# Altium footprint library MyPcbLib.PcbLib: 278 footprints (part 3 of 18)
Each footprint in its own frame and in the unit in brackets; x right, y up, seen from the top. Pads: shape width x height; smd on the part's side, far side on the other; paste and mask are expansions set on the pad; w line width, h text height; cw(c..) or ccw(c..) is an arc to the next point about the centre after c.
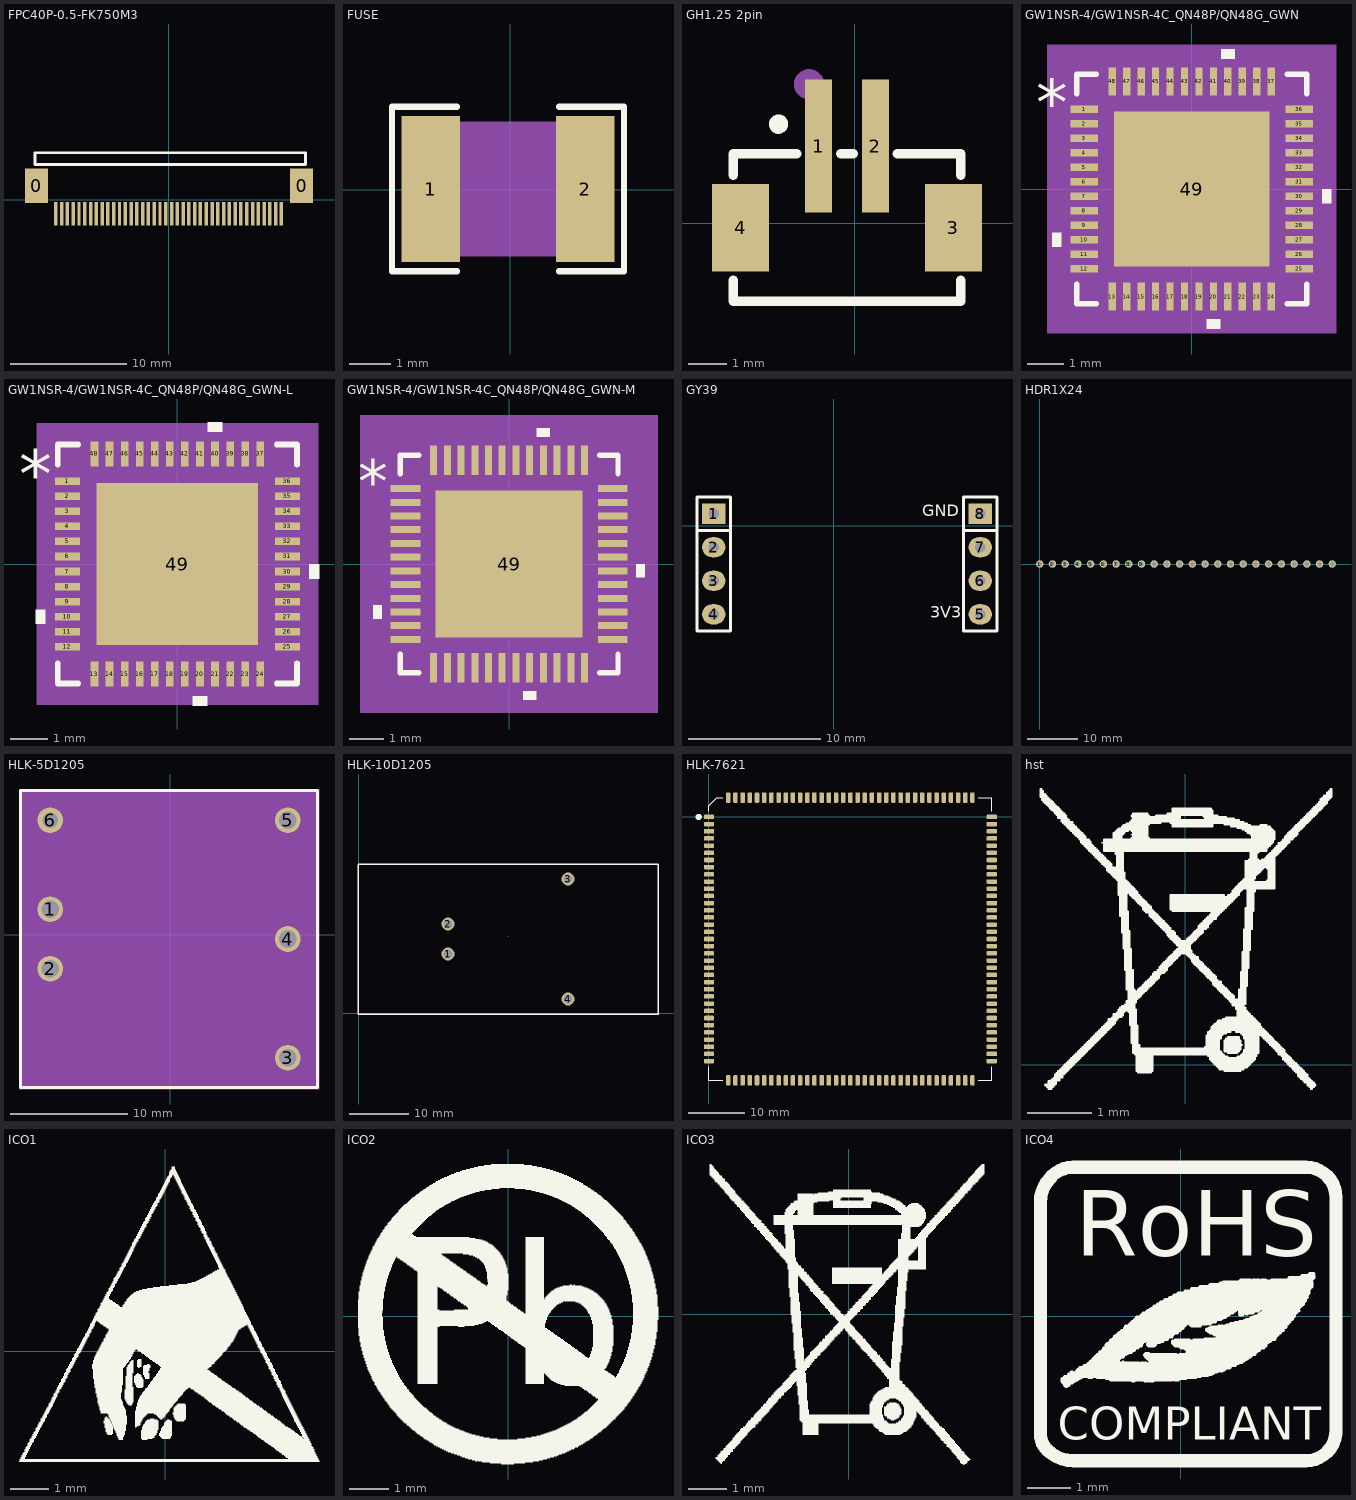
[diagram p2: the footprints below, top view; thin cyan lines are the x and y axes]

## FPC40P-0.5-FK750M3 [mm]
pads (42):
  rect 2x3 smd: 0(-11.465,1.202) 0(11.465,1.202)
  rect 0.3x2 smd: 1(9.721,-1.202) 2(9.221,-1.202) 3(8.721,-1.202) 4(8.221,-1.202) 5(7.721,-1.202) 6(7.221,-1.202) 7(6.721,-1.202) 8(6.221,-1.202) 9(5.721,-1.202) 10(5.221,-1.202) 11(4.721,-1.202) 12(4.221,-1.202) 13(3.721,-1.202) 14(3.221,-1.202) 15(2.721,-1.202) 16(2.221,-1.202) 17(1.721,-1.202) 18(1.221,-1.202) 19(0.721,-1.202) 20(0.221,-1.202) 21(-0.279,-1.202) 22(-0.779,-1.202) 23(-1.279,-1.202) 24(-1.779,-1.202) 25(-2.279,-1.202) 26(-2.779,-1.202) 27(-3.279,-1.202) 28(-3.779,-1.202) 29(-4.279,-1.202) 30(-4.779,-1.202) 31(-5.279,-1.202) 32(-5.779,-1.202) 33(-6.279,-1.202) 34(-6.779,-1.202) 35(-7.279,-1.202) 36(-7.779,-1.202) 37(-8.279,-1.202) 38(-8.779,-1.202) 39(-9.279,-1.202) 40(-9.779,-1.202)
Top Overlay:
  lines w0.254: -11.585,3.049 11.815,3.049 11.815,4.065 -11.585,4.065 -11.585,3.049
3D body "User Library-FPC-40-2.STEP": height 1.95, standoff 0, extent -12.23,-1.755 12.17,4.545

## FUSE [mm]
pads (2):
  rect 1.407x3.499 smd: 1(-1.913,0.022) 2(1.794,0.022)
Top Overlay:
  lines w0.152: -1.286,-1.956 -2.845,-1.956 -2.845,2.001 -1.286,2.001 ; 1.167,-1.956 2.726,-1.956 2.726,2.001 1.167,2.001
Top Paste:
  region: 1.09,-1.627 1.09,-0.672 1.19,-0.572 1.469,-0.572 1.569,-0.472 1.569,0.517 1.469,0.617 1.19,0.617 1.09,0.717 1.09,1.672 1.19,1.772 2.397,1.772 2.497,1.672 2.497,-1.627 2.397,-1.727 1.19,-1.727
  region: -1.21,-1.627 -1.21,-0.672 -1.31,-0.572 -1.588,-0.572 -1.688,-0.472 -1.688,0.517 -1.588,0.617 -1.31,0.617 -1.21,0.717 -1.21,1.672 -1.31,1.772 -2.516,1.772 -2.616,1.672 -2.616,-1.627 -2.516,-1.727 -1.31,-1.727
Mechanical 4:
  region: -2.335,-1.598 -2.335,1.642 2.215,1.642 2.215,-1.598
Mechanical 5:
  region: -2.335,-1.598 -2.335,1.642 -1.585,1.642 -1.585,-1.598
  region: 2.215,-1.598 2.215,1.642 1.465,1.642 1.465,-1.598
Mechanical 6:
  circle w0.06: c-2.335,-1.598 r0.03
Mechanical 15:
  lines w0.003: -0.085,0.399 -0.034,0.449

## GH1.25 2pin [mm]
pads (4):
  rect 0.7x3.5 smd: 1(-0.955,2.034) 2(0.545,2.034)
  rect 1.5x2.3 smd: 3(2.595,-0.116) 4(-3.005,-0.116)
Top Overlay:
  circle w0.254: c-2.007,2.61 r0.127
  lines w0.254: -3.205,-1.497 -3.205,-2.054 2.795,-2.054 2.795,-1.497 ; -3.205,1.265 -3.205,1.834 -1.536,1.834 ; -0.374,1.834 -0.036,1.834 ; 1.126,1.834 2.794,1.834 2.794,1.265
Mechanical 15:
  circle w0.4: c-1.205,3.659 r0.2

## GW1NSR-4/GW1NSR-4C_QN48P/QN48G_GWN [mil]
pads (49):
  rect 30x8 smd paste+0 mask+0: 1(-117,86.61) 2(-117,70.87) 3(-117,55.12) 4(-117,39.37) 5(-117,23.62) 6(-117,7.87) 7(-117,-7.87) 8(-117,-23.62) 9(-117,-39.37) 10(-117,-55.12) 11(-117,-70.87) 12(-117,-86.61) 25(117,-86.61) 26(117,-70.87) 27(117,-55.12) 28(117,-39.37) 29(117,-23.62) 30(117,-7.87) 31(117,7.87) 32(117,23.62) 33(117,39.37) 34(117,55.12) 35(117,70.87) 36(117,86.61)
  rect 8x30 smd paste+0 mask+0: 13(-86.61,-117) 14(-70.87,-117) 15(-55.12,-117) 16(-39.37,-117) 17(-23.62,-117) 18(-7.87,-117) 19(7.87,-117) 20(23.62,-117) 21(39.37,-117) 22(55.12,-117) 23(70.87,-117) 24(86.61,-117) 37(86.61,117) 38(70.87,117) 39(55.12,117) 40(39.37,117) 41(23.62,117) 42(7.87,117) 43(-7.87,117) 44(-23.62,117) 45(-39.37,117) 46(-55.12,117) 47(-70.87,117) 48(-86.61,117)
  rect 169x169 smd paste-84 mask+0: 49(0,0)
Top Overlay:
  region: 46.87,142 31.87,142 31.87,152 46.87,152
  region: 142,-0.37 152,-0.37 152,-15.37 142,-15.37
  region: 31.12,-142 16.12,-142 16.12,-152 31.12,-152
  region: -142,-47.62 -152,-47.62 -152,-62.62 -142,-62.62
  lines w6: -125,-103.71 -125,-125 -103.71,-125 ; -125,103.71 -125,125 -103.71,125 ; 103.71,-125 125,-125 125,-103.71 ; 103.71,125 125,125 125,103.71
  text "*" at -169.5,69.49 h50
Top Paste:
  region: 80.56,-32.1 32.1,-32.1 32.1,-80.56 80.56,-80.56
  region: 80.56,24.23 32.1,24.23 32.1,-24.23 80.56,-24.23
  region: 80.56,80.56 32.1,80.56 32.1,32.1 80.56,32.1
  region: 24.23,-32.1 -24.23,-32.1 -24.23,-80.56 24.23,-80.56
  region: 24.23,24.23 -24.23,24.23 -24.23,-24.23 24.23,-24.23
  region: 24.23,80.56 -24.23,80.56 -24.23,32.1 24.23,32.1
  region: -32.1,-32.1 -80.56,-32.1 -80.56,-80.56 -32.1,-80.56
  region: -32.1,24.23 -80.56,24.23 -80.56,-24.23 -32.1,-24.23
  region: -32.1,80.56 -80.56,80.56 -80.56,32.1 -32.1,32.1
Mechanical 5:
  region: 157,-157 -157,-157 -157,157 157,157
Mechanical 13:
  lines w1: -120,70 -70,120 ; -120,-120 -120,120 120,120 120,-120 -120,-120 ; -120,-91.61 -120,-81.61 -120,-91.61 ; -120,-75.87 -120,-65.87 -120,-75.87 ; -120,-60.12 -120,-50.12 -120,-60.12 ; -120,-44.37 -120,-34.37 -120,-44.37 ; -120,-28.62 -120,-18.62 -120,-28.62 ; -120,-12.87 -120,-2.87 -120,-12.87 ; -120,2.87 -120,12.87 -120,2.87 ; -120,18.62 -120,28.62 -120,18.62 ; -120,34.37 -120,44.37 -120,34.37 ; -120,50.12 -120,60.12 -120,50.12 ; -120,65.87 -120,75.87 -120,65.87 ; -120,81.61 -120,91.61 -120,81.61 ; -91.61,-120 -81.61,-120 -91.61,-120 ; -91.61,120 -81.61,120 -91.61,120 ; -75.87,-120 -65.87,-120 -75.87,-120 ; -75.87,120 -65.87,120 -75.87,120 ; -60.12,-120 -50.12,-120 -60.12,-120 ; -60.12,120 -50.12,120 -60.12,120 ; -44.37,-120 -34.37,-120 -44.37,-120 ; -44.37,120 -34.37,120 -44.37,120 ; -28.62,-120 -18.62,-120 -28.62,-120 ; -28.62,120 -18.62,120 -28.62,120 ; -12.87,-120 -2.87,-120 -12.87,-120 ; -12.87,120 -2.87,120 -12.87,120 ; 2.87,-120 12.87,-120 2.87,-120 ; 2.87,120 12.87,120 2.87,120 ; 18.62,-120 28.62,-120 18.62,-120 ; 18.62,120 28.62,120 18.62,120 ; 34.37,-120 44.37,-120 34.37,-120 ; 34.37,120 44.37,120 34.37,120 ; 50.12,-120 60.12,-120 50.12,-120 ; 50.12,120 60.12,120 50.12,120 ; 65.87,-120 75.87,-120 65.87,-120 ; 65.87,120 75.87,120 65.87,120 ; 81.61,-120 91.61,-120 81.61,-120 ; 81.61,120 91.61,120 81.61,120 ; 120,-91.61 120,-81.61 120,-91.61 ; 120,-75.87 120,-65.87 120,-75.87 ; 120,-60.12 120,-50.12 120,-60.12 ; 120,-44.37 120,-34.37 120,-44.37 ; 120,-28.62 120,-18.62 120,-28.62 ; 120,-12.87 120,-2.87 120,-12.87 ; 120,2.87 120,12.87 120,2.87 ; 120,18.62 120,28.62 120,18.62 ; 120,34.37 120,44.37 120,34.37 ; 120,50.12 120,60.12 120,50.12 ; 120,65.87 120,75.87 120,65.87 ; 120,81.61 120,91.61 120,81.61
  text "*" at -114.5,69.49 h50
Mechanical 15:
  region: -100.61,-130 -130,-130 -130,-100.61 -142,-100.61 -142,100.61 -130,100.61 -130,130 -100.61,130 -100.61,142 100.61,142 100.61,130 130,130 130,100.61 142,100.61 142,-100.61 130,-100.61 130,-130 100.61,-130 100.61,-142 -100.61,-142
  lines w6: -142,-100.61 -142,100.61 -130,100.61 -130,130 -100.61,130 -100.61,142 100.61,142 100.61,130 130,130 130,100.61 142,100.61 142,-100.61 130,-100.61 130,-130 100.61,-130 100.61,-142 -100.61,-142 -100.61,-130 -130,-130 -130,-100.61 -142,-100.61
3D body: height 10, standoff 0, extent 0,0 10,10

## GW1NSR-4/GW1NSR-4C_QN48P/QN48G_GWN-L [mil]
pads (49):
  rect 26x8 smd paste+0 mask+0: 1(-115,86.61) 2(-115,70.87) 3(-115,55.12) 4(-115,39.37) 5(-115,23.62) 6(-115,7.87) 7(-115,-7.87) 8(-115,-23.62) 9(-115,-39.37) 10(-115,-55.12) 11(-115,-70.87) 12(-115,-86.61) 25(115,-86.61) 26(115,-70.87) 27(115,-55.12) 28(115,-39.37) 29(115,-23.62) 30(115,-7.87) 31(115,7.87) 32(115,23.62) 33(115,39.37) 34(115,55.12) 35(115,70.87) 36(115,86.61)
  rect 8x26 smd paste+0 mask+0: 13(-86.61,-115) 14(-70.87,-115) 15(-55.12,-115) 16(-39.37,-115) 17(-23.62,-115) 18(-7.87,-115) 19(7.87,-115) 20(23.62,-115) 21(39.37,-115) 22(55.12,-115) 23(70.87,-115) 24(86.61,-115) 37(86.61,115) 38(70.87,115) 39(55.12,115) 40(39.37,115) 41(23.62,115) 42(7.87,115) 43(-7.87,115) 44(-23.62,115) 45(-39.37,115) 46(-55.12,115) 47(-70.87,115) 48(-86.61,115)
  rect 169x169 smd paste-84 mask+0: 49(0,0)
Top Overlay:
  region: 46.87,138 31.87,138 31.87,148 46.87,148
  region: 138,-0.37 148,-0.37 148,-15.37 138,-15.37
  region: 31.12,-138 16.12,-138 16.12,-148 31.12,-148
  region: -138,-47.62 -148,-47.62 -148,-62.62 -138,-62.62
  lines w6: -125,-103.71 -125,-125 -103.71,-125 ; -125,103.71 -125,125 -103.71,125 ; 103.71,-125 125,-125 125,-103.71 ; 103.71,125 125,125 125,103.71
  text "*" at -165.5,69.49 h50
Top Paste:
  region: 80.56,-32.1 32.1,-32.1 32.1,-80.56 80.56,-80.56
  region: 80.56,24.23 32.1,24.23 32.1,-24.23 80.56,-24.23
  region: 80.56,80.56 32.1,80.56 32.1,32.1 80.56,32.1
  region: 24.23,-32.1 -24.23,-32.1 -24.23,-80.56 24.23,-80.56
  region: 24.23,24.23 -24.23,24.23 -24.23,-24.23 24.23,-24.23
  region: 24.23,80.56 -24.23,80.56 -24.23,32.1 24.23,32.1
  region: -32.1,-32.1 -80.56,-32.1 -80.56,-80.56 -32.1,-80.56
  region: -32.1,24.23 -80.56,24.23 -80.56,-24.23 -32.1,-24.23
  region: -32.1,80.56 -80.56,80.56 -80.56,32.1 -32.1,32.1
Mechanical 5:
  region: 147,-147 -147,-147 -147,147 147,147
Mechanical 13:
  lines w1: -120,70 -70,120 ; -120,-120 -120,120 120,120 120,-120 -120,-120 ; -120,-91.61 -120,-81.61 -120,-91.61 ; -120,-75.87 -120,-65.87 -120,-75.87 ; -120,-60.12 -120,-50.12 -120,-60.12 ; -120,-44.37 -120,-34.37 -120,-44.37 ; -120,-28.62 -120,-18.62 -120,-28.62 ; -120,-12.87 -120,-2.87 -120,-12.87 ; -120,2.87 -120,12.87 -120,2.87 ; -120,18.62 -120,28.62 -120,18.62 ; -120,34.37 -120,44.37 -120,34.37 ; -120,50.12 -120,60.12 -120,50.12 ; -120,65.87 -120,75.87 -120,65.87 ; -120,81.61 -120,91.61 -120,81.61 ; -91.61,-120 -81.61,-120 -91.61,-120 ; -91.61,120 -81.61,120 -91.61,120 ; -75.87,-120 -65.87,-120 -75.87,-120 ; -75.87,120 -65.87,120 -75.87,120 ; -60.12,-120 -50.12,-120 -60.12,-120 ; -60.12,120 -50.12,120 -60.12,120 ; -44.37,-120 -34.37,-120 -44.37,-120 ; -44.37,120 -34.37,120 -44.37,120 ; -28.62,-120 -18.62,-120 -28.62,-120 ; -28.62,120 -18.62,120 -28.62,120 ; -12.87,-120 -2.87,-120 -12.87,-120 ; -12.87,120 -2.87,120 -12.87,120 ; 2.87,-120 12.87,-120 2.87,-120 ; 2.87,120 12.87,120 2.87,120 ; 18.62,-120 28.62,-120 18.62,-120 ; 18.62,120 28.62,120 18.62,120 ; 34.37,-120 44.37,-120 34.37,-120 ; 34.37,120 44.37,120 34.37,120 ; 50.12,-120 60.12,-120 50.12,-120 ; 50.12,120 60.12,120 50.12,120 ; 65.87,-120 75.87,-120 65.87,-120 ; 65.87,120 75.87,120 65.87,120 ; 81.61,-120 91.61,-120 81.61,-120 ; 81.61,120 91.61,120 81.61,120 ; 120,-91.61 120,-81.61 120,-91.61 ; 120,-75.87 120,-65.87 120,-75.87 ; 120,-60.12 120,-50.12 120,-60.12 ; 120,-44.37 120,-34.37 120,-44.37 ; 120,-28.62 120,-18.62 120,-28.62 ; 120,-12.87 120,-2.87 120,-12.87 ; 120,2.87 120,12.87 120,2.87 ; 120,18.62 120,28.62 120,18.62 ; 120,34.37 120,44.37 120,34.37 ; 120,50.12 120,60.12 120,50.12 ; 120,65.87 120,75.87 120,65.87 ; 120,81.61 120,91.61 120,81.61
  text "*" at -114.5,69.49 h50
Mechanical 15:
  region: -94.61,-124 -124,-124 -124,-94.61 -132,-94.61 -132,94.61 -124,94.61 -124,124 -94.61,124 -94.61,132 94.61,132 94.61,124 124,124 124,94.61 132,94.61 132,-94.61 124,-94.61 124,-124 94.61,-124 94.61,-132 -94.61,-132
  lines w6: -132,-94.61 -132,94.61 -124,94.61 -124,124 -94.61,124 -94.61,132 94.61,132 94.61,124 124,124 124,94.61 132,94.61 132,-94.61 124,-94.61 124,-124 94.61,-124 94.61,-132 -94.61,-132 -94.61,-124 -124,-124 -124,-94.61 -132,-94.61
3D body: height 10, standoff 0, extent 0,0 10,10

## GW1NSR-4/GW1NSR-4C_QN48P/QN48G_GWN-M [mil]
pads (49):
  rect 34x8 smd paste+0 mask+0: 1(-119,86.61) 2(-119,70.87) 3(-119,55.12) 4(-119,39.37) 5(-119,23.62) 6(-119,7.87) 7(-119,-7.87) 8(-119,-23.62) 9(-119,-39.37) 10(-119,-55.12) 11(-119,-70.87) 12(-119,-86.61) 25(119,-86.61) 26(119,-70.87) 27(119,-55.12) 28(119,-39.37) 29(119,-23.62) 30(119,-7.87) 31(119,7.87) 32(119,23.62) 33(119,39.37) 34(119,55.12) 35(119,70.87) 36(119,86.61)
  rect 8x34 smd paste+0 mask+0: 13(-86.61,-119) 14(-70.87,-119) 15(-55.12,-119) 16(-39.37,-119) 17(-23.62,-119) 18(-7.87,-119) 19(7.87,-119) 20(23.62,-119) 21(39.37,-119) 22(55.12,-119) 23(70.87,-119) 24(86.61,-119) 37(86.61,119) 38(70.87,119) 39(55.12,119) 40(39.37,119) 41(23.62,119) 42(7.87,119) 43(-7.87,119) 44(-23.62,119) 45(-39.37,119) 46(-55.12,119) 47(-70.87,119) 48(-86.61,119)
  rect 169x169 smd paste-84 mask+0: 49(0,0)
Top Overlay:
  region: -146,-47.62 -156,-47.62 -156,-62.62 -146,-62.62
  region: 31.12,-146 16.12,-146 16.12,-156 31.12,-156
  region: 146,-0.37 156,-0.37 156,-15.37 146,-15.37
  region: 46.87,146 31.87,146 31.87,156 46.87,156
  lines w6: -125,-103.71 -125,-125 -103.71,-125 ; -125,103.71 -125,125 -103.71,125 ; 103.71,-125 125,-125 125,-103.71 ; 103.71,125 125,125 125,103.71
  text "*" at -173.5,69.49 h50
Top Paste:
  region: -32.1,80.56 -80.56,80.56 -80.56,32.1 -32.1,32.1
  region: -32.1,24.23 -80.56,24.23 -80.56,-24.23 -32.1,-24.23
  region: -32.1,-32.1 -80.56,-32.1 -80.56,-80.56 -32.1,-80.56
  region: 24.23,80.56 -24.23,80.56 -24.23,32.1 24.23,32.1
  region: 24.23,24.23 -24.23,24.23 -24.23,-24.23 24.23,-24.23
  region: 24.23,-32.1 -24.23,-32.1 -24.23,-80.56 24.23,-80.56
  region: 80.56,80.56 32.1,80.56 32.1,32.1 80.56,32.1
  region: 80.56,24.23 32.1,24.23 32.1,-24.23 80.56,-24.23
  region: 80.56,-32.1 32.1,-32.1 32.1,-80.56 80.56,-80.56
Mechanical 5:
  region: 171,-171 -171,-171 -171,171 171,171
Mechanical 13:
  lines w1: -120,70 -70,120 ; -120,-120 120,-120 120,120 -120,120 -120,-120 ; -120,-91.61 -120,-81.61 -120,-91.61 ; -120,-75.87 -120,-65.87 -120,-75.87 ; -120,-60.12 -120,-50.12 -120,-60.12 ; -120,-44.37 -120,-34.37 -120,-44.37 ; -120,-28.62 -120,-18.62 -120,-28.62 ; -120,-12.87 -120,-2.87 -120,-12.87 ; -120,2.87 -120,12.87 -120,2.87 ; -120,18.62 -120,28.62 -120,18.62 ; -120,34.37 -120,44.37 -120,34.37 ; -120,50.12 -120,60.12 -120,50.12 ; -120,65.87 -120,75.87 -120,65.87 ; -120,81.61 -120,91.61 -120,81.61 ; -91.61,-120 -81.61,-120 -91.61,-120 ; -91.61,120 -81.61,120 -91.61,120 ; -75.87,-120 -65.87,-120 -75.87,-120 ; -75.87,120 -65.87,120 -75.87,120 ; -60.12,-120 -50.12,-120 -60.12,-120 ; -60.12,120 -50.12,120 -60.12,120 ; -44.37,-120 -34.37,-120 -44.37,-120 ; -44.37,120 -34.37,120 -44.37,120 ; -28.62,-120 -18.62,-120 -28.62,-120 ; -28.62,120 -18.62,120 -28.62,120 ; -12.87,-120 -2.87,-120 -12.87,-120 ; -12.87,120 -2.87,120 -12.87,120 ; 2.87,-120 12.87,-120 2.87,-120 ; 2.87,120 12.87,120 2.87,120 ; 18.62,-120 28.62,-120 18.62,-120 ; 18.62,120 28.62,120 18.62,120 ; 34.37,-120 44.37,-120 34.37,-120 ; 34.37,120 44.37,120 34.37,120 ; 50.12,-120 60.12,-120 50.12,-120 ; 50.12,120 60.12,120 50.12,120 ; 65.87,-120 75.87,-120 65.87,-120 ; 65.87,120 75.87,120 65.87,120 ; 81.61,-120 91.61,-120 81.61,-120 ; 81.61,120 91.61,120 81.61,120 ; 120,-91.61 120,-81.61 120,-91.61 ; 120,-75.87 120,-65.87 120,-75.87 ; 120,-60.12 120,-50.12 120,-60.12 ; 120,-44.37 120,-34.37 120,-44.37 ; 120,-28.62 120,-18.62 120,-28.62 ; 120,-12.87 120,-2.87 120,-12.87 ; 120,2.87 120,12.87 120,2.87 ; 120,18.62 120,28.62 120,18.62 ; 120,34.37 120,44.37 120,34.37 ; 120,50.12 120,60.12 120,50.12 ; 120,65.87 120,75.87 120,65.87 ; 120,81.61 120,91.61 120,81.61
  text "*" at -114.5,69.49 h50
Mechanical 15:
  region: -110.61,-140 -140,-140 -140,-110.61 -156,-110.61 -156,110.61 -140,110.61 -140,140 -110.61,140 -110.61,156 110.61,156 110.61,140 140,140 140,110.61 156,110.61 156,-110.61 140,-110.61 140,-140 110.61,-140 110.61,-156 -110.61,-156
  lines w6: -156,-110.61 -140,-110.61 -140,-140 -110.61,-140 -110.61,-156 110.61,-156 110.61,-140 140,-140 140,-110.61 156,-110.61 156,110.61 140,110.61 140,140 110.61,140 110.61,156 -110.61,156 -110.61,140 -140,140 -140,110.61 -156,110.61 -156,-110.61
3D body: height 10, standoff 0, extent 0,0 10,10

## GY39 [mil]
pads (8):
  rect 70x60 hole 32: 1(-357.99,35.43) 8(437.01,35.43)
  oval 70x60 hole 32: 2(-357.99,-64.57) 3(-357.99,-164.57) 4(-357.99,-264.57) 5(437.01,-264.57) 6(437.01,-164.57) 7(437.01,-64.57)
Top Overlay:
  lines w10: -407.99,-14.57 -307.99,-14.57 ; 387.01,-14.57 487.01,-14.57 ; -407.99,-314.57 -407.99,85.43 -307.99,85.43 -307.99,-314.57 -407.99,-314.57 ; 387.01,-314.57 387.01,85.43 487.01,85.43 487.01,-314.57 387.01,-314.57
  text "3V3" at 287.4,-286.74 h60
  text "GND" at 263.78,16.41 h60
3D body "Female-Header-2.54-Single-4.stp": height 334.65, standoff -125.98, extent 392.8,-319.49 491.23,90.36
3D body "Female-Header-2.54-Single-4.stp": height 334.65, standoff -125.98, extent -402.2,-319.49 -303.77,90.36

## HDR1X24 [mm] "Connector; Header; 24 Position"
pads (24):
  round 1.5 hole 0.9: 1(0,0) 2(2.54,0) 3(5.08,0) 4(7.62,0) 5(10.16,0) 6(12.7,0) 7(15.24,0) 8(17.78,0) 9(20.32,0) 10(22.86,0) 11(25.4,0) 12(27.94,0) 13(30.48,0) 14(33.02,0) 15(35.56,0) 16(38.1,0) 17(40.64,0) 18(43.18,0) 19(45.72,0) 20(48.26,0) 21(50.8,0) 22(53.34,0) 23(55.88,0) 24(58.42,0)

## HLK-5D1205 [mil]
pads (6):
  round 86.61 hole 59.06: 1(-405,85) 2(-405,-115) 3(395,-415) 4(395,-15) 5(395,385)
  round 86.61 hole 52: 6(-405,385)
Top Overlay:
  lines w10: -505,-515 -505,485 495,485 495,-515 -505,-515
Mechanical 4:
  region: -510,490 500,490 500,-520 -510,-520
Mechanical 5:
  region: 351.69,28.31 438.31,28.31 438.31,-58.31 351.69,-58.31
  region: 351.69,-371.69 438.31,-371.69 438.31,-458.31 351.69,-458.31
  region: 351.69,428.31 438.31,428.31 438.31,341.69 351.69,341.69
  region: -448.31,428.31 -361.69,428.31 -361.69,341.69 -448.31,341.69
  region: -448.31,-71.69 -361.69,-71.69 -361.69,-158.31 -448.31,-158.31
  region: -448.31,128.31 -361.69,128.31 -361.69,41.69 -448.31,41.69
Mechanical 15:
  lines w0.1: -6,2.75 -4,4.75

## HLK-10D1205 [mm]
pads (4):
  round 2.2 hole 1.5: 1(15.113,10.033) 2(15.113,15.113) 3(35.433,22.733) 4(35.433,2.413)
Top Overlay:
  lines w0.254: -0.127,-0.127 50.673,-0.127 50.673,25.273 -0.127,25.273 -0.127,-0.127
Mechanical 15:
  lines w0.003: 25.273,13.049 25.273,13.05

## HLK-7621 [mm]
height 1
pads (141):
  rrect50% 1.85x0.8 smd: 1(0,0) 2(0,-1.27) 3(0,-2.54) 4(0,-3.81) 5(0,-5.08) 6(0,-6.35) 7(0,-7.62) 8(0,-8.89) 9(0,-10.16) 10(0,-11.43) 11(0,-12.7) 12(0,-13.97) 13(0,-15.24) 14(0,-16.51) 15(0,-17.78) 16(0,-19.05) 17(0,-20.32) 18(0,-21.59) 19(0,-22.86) 20(0,-24.13) 21(0,-25.4) 22(0,-26.67) 23(0,-27.94) 24(0,-29.21) 25(0,-30.48) 26(0,-31.75) 27(0,-33.02) 28(0,-34.29) 29(0,-35.56) 30(0,-36.83) 31(0,-38.1) 32(0,-39.37) 33(0,-40.64) 34(0,-41.91) 35(0,-43.18) 71(50,-43.18) 72(50,-41.91) 73(50,-40.64) 74(50,-39.37) 75(50,-38.1) 76(50,-36.83) 77(50,-35.56) 78(50,-34.29) 79(50,-33.02) 80(50,-31.75) 81(50,-30.48) 82(50,-29.21) 83(50,-27.94) 84(50,-26.67) 85(50,-25.4) 86(50,-24.13) 87(50,-22.86) 88(50,-21.59) 89(50,-20.32) 90(50,-19.05) 91(50,-17.78) 92(50,-16.51) 93(50,-15.24) 94(50,-13.97) 95(50,-12.7) 96(50,-11.43) 97(50,-10.16) 98(50,-8.89) 99(50,-7.62) 100(50,-6.35) 101(50,-5.08) 102(50,-3.81) 103(50,-2.54) 104(50,-1.27) 105(50,0)
  rrect50% 0.8x1.85 smd: 36(3.41,-46.59) 37(4.68,-46.59) 38(5.95,-46.59) 39(7.22,-46.59) 40(8.49,-46.59) 41(9.76,-46.59) 42(11.03,-46.59) 43(12.3,-46.59) 44(13.57,-46.59) 45(14.84,-46.59) 46(16.11,-46.59) 47(17.38,-46.59) 48(18.65,-46.59) 49(19.92,-46.59) 50(21.19,-46.59) 51(22.46,-46.59) 52(23.73,-46.59) 53(25,-46.59) 54(26.27,-46.59) 55(27.54,-46.59) 56(28.81,-46.59) 56(28.81,-46.59) 57(30.08,-46.59) 58(31.35,-46.59) 59(32.62,-46.59) 60(33.89,-46.59) 61(35.16,-46.59) 62(36.43,-46.59) 63(37.7,-46.59) 64(38.97,-46.59) 65(40.24,-46.59) 66(41.51,-46.59) 67(42.78,-46.59) 68(44.05,-46.59) 69(45.32,-46.59) 70(46.59,-46.59) 106(46.59,3.41) 107(45.32,3.41) 108(44.05,3.41) 109(42.78,3.41) 110(41.51,3.41) 111(40.24,3.41) 112(38.97,3.41) 113(37.7,3.41) 114(36.43,3.41) 115(35.16,3.41) 116(33.89,3.41) 117(32.62,3.41) 118(31.35,3.41) 119(30.08,3.41) 120(28.81,3.41) 121(27.54,3.41) 122(26.27,3.41) 123(25,3.41) 124(23.73,3.41) 125(22.46,3.41) 126(21.19,3.41) 127(19.92,3.41) 128(18.65,3.41) 129(17.38,3.41) 130(16.11,3.41) 131(14.84,3.41) 132(13.57,3.41) 133(12.3,3.41) 134(11.03,3.41) 135(9.76,3.41) 136(8.49,3.41) 137(7.22,3.41) 138(5.95,3.41) 139(4.68,3.41) 140(3.41,3.41)
Top Overlay:
  circle w0.5: c-1.82,-0.014 r0.3
  lines w0.15: 0,-44.18 0,-46.59 2.41,-46.59 ; 0,1 0,2 1.41,3.41 2.41,3.41 ; 47.59,-46.59 50,-46.59 50,-44.18 ; 47.59,3.41 50,3.41 50,1

## hst [mm]
Top Overlay:
  drawing of 1279 lines, arcs and shapes, not listed

## ICO1 [mm]
Top Overlay:
  drawing of 990 lines, arcs and shapes, not listed

## ICO2 [mm]
Top Overlay:
  drawing of 960 lines, arcs and shapes, not listed

## ICO3 [mm]
Top Overlay:
  drawing of 1026 lines, arcs and shapes, not listed

## ICO4 [mm]
Top Overlay:
  drawing of 1541 lines, arcs and shapes, not listed
  text "COMPLIANT" at -2.845,-2.869 h0.76
  text "RoHS" at -2.438,1.398 h1.52